# Altium footprint library USB-Mini_USB-Micro_USB.PcbLib: 33 footprints (part 2 of 3)
Each footprint in its own frame and in the unit in brackets; x right, y up, seen from the top. Pads: shape width x height; smd on the part's side, far side on the other; paste and mask are expansions set on the pad; w line width, h text height; cw(c..) or ccw(c..) is an arc to the next point about the centre after c.
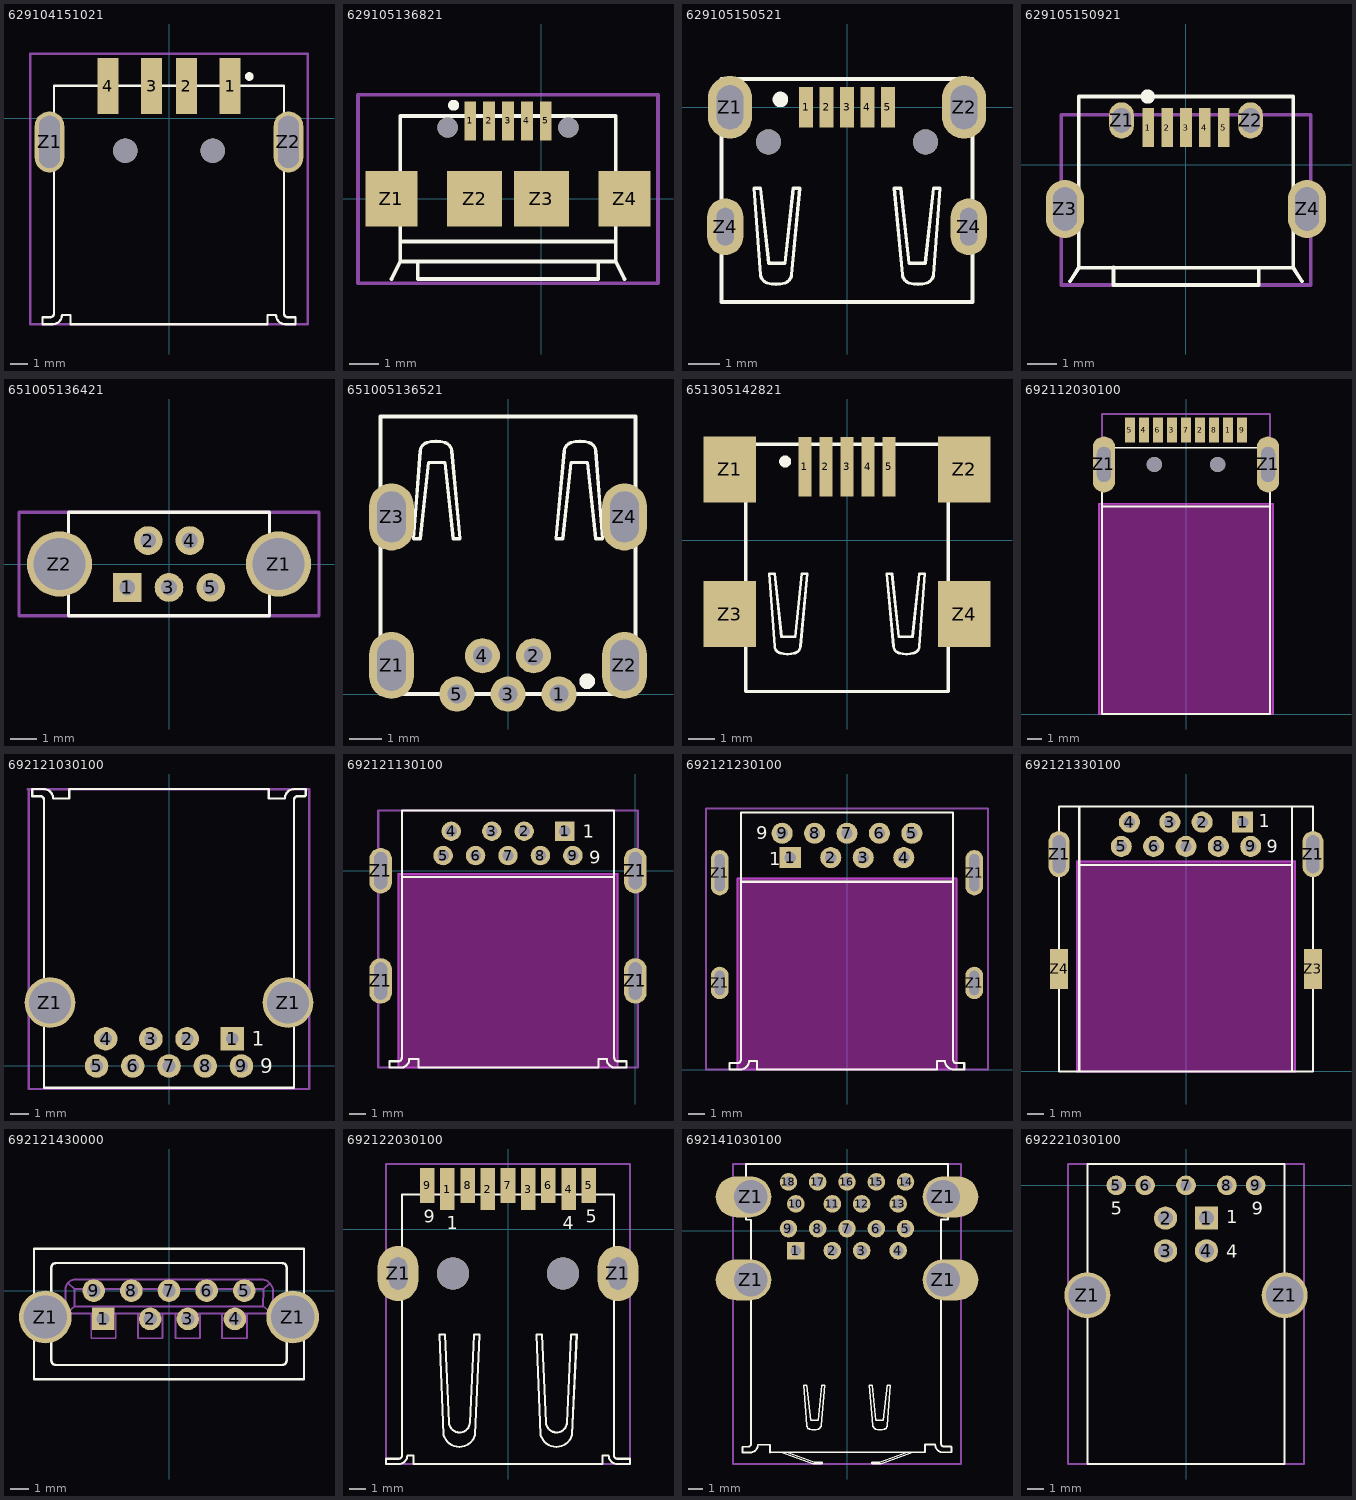
[diagram p1: the footprints below, top view; thin cyan lines are the x and y axes]

## 629104151021 [mm] "WR-COM_USB_Type A_Horizontal_SMT Type A Horizontal SMT - with Pegs - T&R Packaging"
height 7
pads (8):
  rect 1.2x3.2 smd: 1(3.5,1.85) 2(1,1.85) 3(-1,1.85) 4(-3.5,1.85)
  oval 1.7x3.5 hole 1.2 slot 3 at 90 deg: Z1(-6.85,-1.35) Z2(6.85,-1.35)
  round 1.4 hole 1.4 unplated: ""(-2.5,-1.85) ""(2.5,-1.85)
Top Overlay:
  circle w0.254: c4.6,2.4 r0.12
  lines w0.127: -7.25,-11.8 -7.25,-11.405 -6.798,-11.405 ccw(c-6.798,-11.208) -6.601,-11.208 -6.601,1.87 6.601,1.87 6.601,-11.208 ccw(c6.798,-11.208) 6.798,-11.405 7.25,-11.405 7.25,-11.8 6.667,-11.8 cw(c6.667,-11.273) 6.14,-11.273 5.64,-11.273 5.64,-11.8 -5.64,-11.8 -5.64,-11.273 -6.14,-11.273 cw(c-6.667,-11.273) -6.667,-11.8 -7.25,-11.8
Mechanical 15:
  lines w0.127: -7.95,-11.8 7.95,-11.8 7.95,3.7 -7.95,3.7 -7.95,-11.8
3D body: height 7.31, standoff -2.19, extent -7.25,-11.8 7.25,3.4

## 629105136821 [mm] "5 pins"
height 3
pads (11):
  rect 0.4x1.35 smd: 1(-2.45,2.675) 2(-1.8,2.675) 3(-1.15,2.675) 4(-0.5,2.675) 5(0.15,2.675)
  rect 1.8x1.9 smd: Z1(-5.15,0) Z4(2.85,0)
  rect 1.9x1.9 smd: Z2(-2.3,0) Z3(0,0)
  round 0.7 hole 0.7 unplated: ""(-3.225,2.45) ""(0.925,2.45)
Top Overlay:
  circle w0.254: c-3.02,3.215 r0.06
  lines w0.127: -5.15,-2.753 -4.85,-2.153 ; -4.85,-1.463 2.55,-1.463 ; -4.25,-2.153 -4.25,-2.75 1.95,-2.75 1.95,-2.153 ; 2.85,-2.753 2.55,-2.153 ; -4.85,-2.153 2.55,-2.153 ; -4.85,-2.153 -4.85,2.847 2.55,2.847 2.55,-2.153
Mechanical 15:
  lines w0.127: -6.3,-2.896 4,-2.896 4,3.575 -6.3,3.575 -6.3,-2.896
3D body: height 2.69, standoff -0.61, extent -5.15,-2.756 2.85,3.148

## 629105150521 [mm] "WR-COM_USB_Micro Type B_Horizontal_SMT Micro Type B Horizontal SMT - 3A current at Pin1 & Pin 5 - with Pegs and THT shielding Pins  - T&R Packaging"
height 2.6
pads (11):
  rect 0.45x1.3 smd: 1(-1.3,0) 2(-0.65,0) 3(0,0) 4(0.65,0) 5(1.3,0)
  oval 1.4x2 hole 0.85 slot 1.4 at 90 deg: Z1(-3.725,0) Z2(3.725,0)
  oval 1.15x1.8 hole 0.55 slot 1.2 at 90 deg: Z4(-3.875,-3.8) Z4(3.875,-3.8)
  round 0.8 hole 0.8 unplated: ""(-2.5,-1.1) ""(2.5,-1.1)
Top Overlay:
  circle w0.254: c-2.12,0.25 r0.12
  lines w0.102: -2.751,-5.328 -2.959,-2.577 -2.751,-2.577 -2.492,-4.965 -1.973,-4.965 -1.713,-2.577 -1.505,-2.577 -1.765,-5.328 ; -2.751,-5.328 ccw(c-2.457,-5.306) -2.544,-5.588 ccw(c-2.258,-4.657) -1.973,-5.588 ccw(c-2.059,-5.306) -1.765,-5.328 ; 1.765,-5.328 1.505,-2.577 1.713,-2.577 1.973,-4.965 2.492,-4.965 2.751,-2.577 2.959,-2.577 2.751,-5.328 ; 1.765,-5.328 ccw(c2.059,-5.306) 1.973,-5.588 ccw(c2.258,-4.657) 2.544,-5.588 ccw(c2.457,-5.306) 2.751,-5.328
  lines w0.127: -4,-6.2 4,-6.2 4,0.9 -4,0.9 -4,-6.2
3D body: height 2.67, standoff -0.89, extent -4.001,-6.25 3.999,0.353

## 629105150921 [mm] "WR-COM_USB_Micro Type AB_Horizontal_SMT Micro Type AB Horizontal SMT - with Pegs - T&R Packaging"
height 5
pads (9):
  rect 0.4x1.35 smd: 1(-1.3,1.278) 2(-0.65,1.278) 3(0,1.278) 4(0.65,1.278) 5(1.3,1.278)
  oval 0.85x1.25 hole 0.65 slot 0.85 at 90 deg: Z1(-2.225,1.528) Z2(2.225,1.528)
  oval 1.325x2 hole 0.825 slot 1.5 at 90 deg: Z3(-4.175,-1.527) Z4(4.175,-1.527)
Top Overlay:
  circle w0.254: c-1.32,2.35 r0.12
  lines w0.127: -4,-4.027 -3.7,-3.557 ; -2.5,-3.55 -2.5,-4.15 2.51,-4.15 2.51,-3.557 ; 4,-4.027 3.7,-3.557 ; -3.7,-3.557 -3.7,2.35 3.7,2.35 3.7,-3.557 ; -3.7,-3.557 3.7,-3.557
Mechanical 15:
  lines w0.127: -4.3,-4.15 -4.3,1.72 4.3,1.72 4.3,-4.15 -4.3,-4.15
3D body: height 2.73, standoff -0.55, extent -4.3,-4.15 4.3,1.72

## 651005136421 [mm] "5 pins"
height 3.9
pads (7):
  rect 1.1x1.1 hole 0.6: 1(-1.6,-0.9)
  round 1.1 hole 0.6: 2(-0.8,0.9) 3(0,-0.9) 4(0.8,0.9) 5(1.6,-0.9)
  round 2.5 hole 2: Z1(4.2,0) Z2(-4.2,0)
Top Overlay:
  lines w0.127: -3.85,-1.98 3.85,-1.98 3.85,1.98 -3.85,1.98 -3.85,-1.98
Mechanical 15:
  lines w0.127: -5.75,-1.98 5.75,-1.98 5.75,1.98 -5.75,1.98 -5.75,-1.98
3D body: height 9.21, standoff -2.79, extent -5.098,-1.95 5.098,1.95

## 651005136521 [mm] "5 pins"
height 3.9
pads (9):
  round 1.1 hole 0.6: 1(1.6,0) 2(0.8,1.2) 3(0,0) 4(-0.8,1.2) 5(-1.6,0)
  oval 1.4x2.1 hole 0.9 slot 1.6 at 90 deg: Z1(-3.65,0.9) Z2(3.65,0.9) Z3(-3.65,5.55) Z4(3.65,5.55)
Top Overlay:
  circle w0.254: c2.48,0.4 r0.12
  lines w0.102: -2.959,4.867 -2.751,4.867 -2.492,7.255 -1.973,7.255 -1.713,4.867 -1.505,4.867 -1.765,7.618 ccw(c-2.059,7.596) -1.972,7.878 ccw(c-2.258,6.947) -2.544,7.878 ccw(c-2.457,7.596) -2.751,7.618 -2.959,4.867 ; 1.505,4.867 1.713,4.867 1.973,7.255 2.492,7.255 2.751,4.867 2.959,4.867 2.751,7.618 ccw(c2.457,7.596) 2.544,7.878 ccw(c2.258,6.947) 1.973,7.878 ccw(c2.059,7.596) 1.765,7.618 1.505,4.867
  lines w0.127: -4,0 -4,8.7 4,8.7 4,0 -4,0
3D body: height 3.91, standoff -2.59, extent -4.075,-0.125 4.075,8.7

## 651305142821 [mm] "5 pins"
height 4
pads (9):
  rect 0.5x2.25 smd: 1(-1.6,2.8) 2(-0.8,2.8) 3(0,2.8) 4(0.8,2.8) 5(1.6,2.8)
  rect 2x2.5 smd: Z1(-4.45,2.7) Z2(4.45,2.7) Z3(-4.45,-2.8) Z4(4.45,-2.8)
Top Overlay:
  circle w0.254: c-2.35,3 r0.1
  lines w0.102: -2.544,-4.278 cw(c-2.457,-3.996) -2.751,-4.019 -2.959,-1.267 -2.751,-1.267 -2.492,-3.655 -1.973,-3.655 -1.713,-1.267 -1.505,-1.267 -1.765,-4.018 cw(c-2.059,-3.996) -1.973,-4.278 ; -2.544,-4.278 ccw(c-2.258,-3.347) -1.973,-4.278 ; 1.973,-4.278 cw(c2.059,-3.996) 1.765,-4.019 1.505,-1.267 1.713,-1.267 1.973,-3.655 2.492,-3.655 2.751,-1.267 2.959,-1.267 2.751,-4.018 cw(c2.457,-3.996) 2.544,-4.278 ; 1.973,-4.278 ccw(c2.258,-3.347) 2.544,-4.278
  lines w0.127: -3.85,-5.74 3.85,-5.74 3.85,3.66 -3.85,3.66 -3.85,-5.74
3D body: height -0.27, standoff -4.37, extent -4.95,-5.74 4.95,3.66

## 692112030100 [mm] "Plug SMT"
height 0.85
pads (13):
  rect 0.7x1.8 smd: 1(3,20.25) 2(1,20.25) 3(-1,20.25) 4(-3,20.25) 5(-4,20.25) 6(-2,20.25) 7(0,20.25) 8(2,20.25) 9(4,20.25)
  oval 1.6x4 hole 1 slot 2.5 at 90 deg: Z1(-5.85,17.8) Z1(5.85,17.8)
  round 1.1 hole 1.1 unplated: ""(-2.25,17.8) ""(2.25,17.8)
Top Overlay:
  lines w0.127: -6,14.8 6,14.8 ; -6,0 -6,18.99 6,18.99 6,0 -6,0
Keep-Out Layer:
  board cut-out: -6.2,0 6.2,0 6.2,15 -6.2,15
Mechanical 1:
  text "Milling Area" at -3.5,7.125 h1.52
Mechanical 1 keep-out:
  lines w0.127: -6.2,0 6.2,0 6.2,15 -6.2,15 -6.2,0
Mechanical 15:
  lines w0.127: -6,0 6,0 6,21.4 -6,21.4 -6,0
3D body: height 1.89, standoff -2.61, extent -5.998,0 6.002,20.754

## 692121030100 [mm] "Receptacle Through hole"
height 6.99
pads (11):
  rect 1.3x1.3 hole 0.7: 1(3.5,1.5)
  round 1.3 hole 0.7: 2(1,1.5) 3(-1,1.5) 4(-3.5,1.5) 5(-4,0) 6(-2,0) 7(0,0) 8(2,0) 9(4,0)
  round 2.8 hole 2.3: Z1(-6.57,3.5) Z1(6.57,3.5)
Top Overlay:
  lines w0.127: -7.55,14.897 -7.55,15.292 -6.927,15.292 cw(c-6.927,14.766) -6.4,14.766 -5.5,14.766 -5.5,15.292 5.5,15.292 5.5,14.766 6.4,14.766 cw(c6.926,14.766) 6.926,15.292 7.55,15.292 7.55,14.963 cw(c7.484,14.963) 7.484,14.897 7.097,14.897 ccw(c7.097,14.7) 6.9,14.7 6.9,-1.2 -6.9,-1.2 -6.9,14.7 ccw(c-7.097,14.7) -7.097,14.897 -7.55,14.897
  text "9" at 5.05,-0.4 h0.8
  text "1" at 4.58,1.12 h0.8
Mechanical 15:
  lines w0.127: -7.8,15.28 7.74,15.28 7.74,-1.27 -7.74,-1.27 -7.74,15.21
3D body: height 7.99, standoff -3.23, extent -7.74,-1.27 7.74,15.28

## 692121130100 [mm] "Receptacle TH Reverse Offset 0.14mm"
height 1.84
pads (13):
  rect 1.2x1.2 hole 0.7: 1(-4.35,2.43)
  round 1.2 hole 0.7: 2(-6.85,2.43) 3(-8.85,2.43) 4(-11.35,2.43) 5(-11.85,0.93) 6(-9.85,0.93) 7(-7.85,0.93) 8(-5.85,0.93) 9(-3.85,0.93)
  oval 1.4x2.8 hole 0.8 slot 2.3 at 90 deg: Z1(-15.7,-6.8) Z1(-15.7,0) Z1(0,-6.8) Z1(0,0)
Top Overlay:
  lines w0.127: -14.402,-11.558 cw(c-14.6,-11.558) -14.6,-11.755 -15.165,-11.755 -15.165,-12.15 -14.468,-12.15 ccw(c-14.468,-11.624) -13.942,-11.624 -13.36,-11.624 -13.36,-12.15 -2.258,-12.15 -2.258,-11.624 -1.758,-11.624 ccw(c-1.232,-11.624) -1.232,-12.15 -0.535,-12.15 -0.535,-11.755 -1.1,-11.755 cw(c-1.1,-11.558) -1.297,-11.558 ; -14.4,-11.59 -14.4,3.72 -1.3,3.72 -1.3,-11.55 ; -14.4,-0.4 -1.3,-0.4
  text "9" at -2.85,0.43 h0.8
  text "1" at -3.25,2.03 h0.8
Keep-Out Layer:
  board cut-out: -14.6,-0.2 -1.1,-0.2 -1.1,-12.15 -14.6,-12.15
Mechanical 1:
  text "Milling Area" at -11.45,-6.77 h1.52
Mechanical 1 keep-out:
  lines w0.127: -14.6,-12.15 -14.6,-0.2 -1.1,-0.2 -1.1,-12.15 -14.6,-12.15
Mechanical 15:
  lines w0.127: -15.85,-12.15 -15.85,3.72 0.15,3.72 0.15,-12.15 -15.85,-12.15
3D body: height 3.71, standoff -3.41, extent -15.85,-12.15 0.15,3.72

## 692121230100 [mm] "Receptacle Through hole Offset 1.04mm"
height 3.9
pads (13):
  rect 1.3x1.3 hole 0.7: 1(-3.5,13.08)
  round 1.3 hole 0.7: 2(-1,13.08) 3(1,13.08) 4(3.5,13.08) 5(4,14.58) 6(2,14.58) 7(0,14.58) 8(-2,14.58) 9(-4,14.58)
  oval 1.1x2 hole 0.6 slot 1.5 at 90 deg: Z1(-7.85,5.35) Z1(7.85,5.35)
  oval 1.1x2.8 hole 0.6 slot 2.3 at 90 deg: Z1(-7.85,12.15) Z1(7.85,12.15)
Top Overlay:
  lines w0.127: -6.55,11.59 6.55,11.59 ; 6.55,0.6 ccw(c6.747,0.6) 6.747,0.403 7.23,0.403 7.23,0.008 6.576,0.008 cw(c6.576,0.534) 6.05,0.534 5.55,0.534 5.55,0 -5.55,0 -5.55,0.534 -6.05,0.534 cw(c-6.577,0.534) -6.577,0.008 -7.25,0.008 -7.25,0.403 -6.748,0.403 ccw(c-6.748,0.6) -6.55,0.6 -6.55,15.87 6.55,15.87 6.55,0.6
  text "1" at -4.8,12.6 h0.8
  text "9" at -5.6,14.2 h0.8
Keep-Out Layer:
  board cut-out: -6.75,11.79 6.75,11.79 6.75,0 -6.75,0
Mechanical 1:
  text "Milling Area" at -3.6,5.38 h1.52
Mechanical 1 keep-out:
  lines w0.127: -6.75,0 6.75,0 6.75,11.79 -6.75,11.79 -6.75,0
Mechanical 15:
  lines w0.127: -8.7,0 8.7,0 8.7,16.12 -8.7,16.12 -8.7,0
3D body: height 2.09, standoff -5.03, extent -8,-0.005 8,15.865

## 692121330100 [mm] "Receptacle TH Reverse Offset 1.75mm"
height 4.54
pads (13):
  rect 1.3x1.3 hole 0.7: 1(3.5,15.41)
  round 1.3 hole 0.7: 2(1,15.41) 3(-1,15.41) 4(-3.5,15.41) 5(-4,13.91) 6(-2,13.91) 7(0,13.91) 8(2,13.91) 9(4,13.91)
  oval 1.3x2.85 hole 0.8 slot 2.35 at 90 deg: Z1(-7.85,13.43) Z1(7.85,13.43)
  rect 1.1x2.5 smd: Z3(7.85,6.33) Z4(-7.85,6.33)
Top Overlay:
  lines w0.127: -6.55,12.77 6.55,12.77 ; -7.85,0 -7.85,16.37 7.85,16.37 7.85,0 -7.85,0 ; -6.6,0 6.55,0 6.55,16.37 -6.6,16.37 -6.6,0
  text "9" at 5,13.51 h0.8
  text "1" at 4.5,15.11 h0.8
Keep-Out Layer:
  board cut-out: -6.75,12.97 6.75,12.97 6.75,0 -6.75,0
Mechanical 1:
  text "Milling Area" at -3.3,5.01 h1.52
Mechanical 1 keep-out:
  lines w0.127: -6.75,0 6.75,0 6.75,12.97 -6.75,12.97 -6.75,0
3D body: height 2.95, standoff -4.45, extent -8,0 8,16.37

## 692121430000 [mm] "Receptacle Through hole"
height 15
pads (11):
  rect 1.2x1.2 hole 0.7: 1(-3.5,-1.5)
  round 1.2 hole 0.7: 2(-1,-1.5) 3(1,-1.5) 4(3.5,-1.5) 5(4,0) 6(2,0) 7(0,0) 8(-2,0) 9(-4,0)
  round 2.8 hole 2.3: Z1(-6.57,-1.4) Z1(6.57,-1.4)
Top Overlay:
  lines w0.127: -6.25,-3.73 -6.25,1.22 ; -6.25,-3.7 ccw(c-6,-3.7) -6,-3.95 ; -6.25,1.22 cw(c-6,1.22) -6,1.47 6,1.47 cw(c6,1.22) 6.25,1.22 6.25,-3.7 cw(c6,-3.7) 6,-3.95 -6.03,-3.95 ; -7.175,-4.715 7.175,-4.715 7.175,2.235 -7.175,2.235 -7.175,-4.715
Mechanical 13:
  lines w0.102: -5.355,0.386 -5.012,0.086 ; -4.134,-1.242 -4.134,-2.527 -2.827,-2.527 -2.827,-1.242 ; -1.649,-1.242 -1.649,-2.527 -0.343,-2.527 -0.343,-1.264 ; 0.343,-1.285 0.343,-2.527 1.649,-2.527 1.649,-1.242 1.671,-1.242 ; 2.806,-1.264 2.806,-2.527 4.134,-2.527 4.134,-1.264 ; 5.333,0.364 5.012,0.086 ; -5.483,-1.221 5.526,-1.221 ; -5.483,-1.221 -5.504,-1.221 -5.504,0.064 cw(c-4.969,0.064) -4.969,0.6 4.883,0.6 cw(c4.883,-0.043) 5.526,-0.043 5.526,-1.221 ; -5.483,-1.221 -5.012,-0.835 ; -5.012,-0.835 4.99,-0.835 ; -5.012,-0.835 -5.012,0.086 ; -5.012,0.086 5.012,0.086 ; 4.99,-0.835 5.526,-1.221 ; 4.99,-0.835 5.012,0.086
3D body: height 15.01, standoff -3.76, extent -7.799,-4.715 7.799,2.235

## 692122030100 [mm] "Receptacle Dual port TH"
height 6.99
pads (13):
  rect 0.9x2.6 smd: 1(-3.75,2.498) 2(-1.25,2.498) 3(1.25,2.498) 4(3.75,2.498)
  rect 0.9x2.15 smd: 5(5,2.723) 6(2.5,2.723) 7(0,2.723) 8(-2.5,2.723) 9(-5,2.723)
  oval 2.52x3.4 hole 1.12 slot 2 at 90 deg: Z1(-6.8,-2.723) Z1(6.8,-2.723)
  round 2 hole 2 unplated: ""(-3.4,-2.723) ""(3.4,-2.723)
Top Overlay:
  lines w0.127: 2.099,-6.499 1.766,-6.499 2.02,-12.695 ccw(c2.991,-12.442) 3.961,-12.703 4.25,-6.5 3.9,-6.5 3.65,-11.95 cw(c3,-11.9) 2.348,-11.913 2.1,-6.5 ; -7.55,-14.5 -6.754,-14.5 ccw(c-6.754,-13.973) -6.228,-13.973 -5.85,-13.973 -5.85,-14.5 5.85,-14.5 5.85,-13.973 6.228,-13.973 ccw(c6.754,-13.973) 6.754,-14.5 7.55,-14.5 7.55,-14.179 6.755,-14.179 cw(c6.755,-13.973) 6.55,-13.973 6.55,2.15 -6.55,2.15 -6.55,-13.973 cw(c-6.755,-13.973) -6.755,-14.179 -7.55,-14.179 -7.55,-14.5 ; -4.234,-6.499 -3.98,-12.695 ccw(c-3.009,-12.442) -2.039,-12.703 -1.75,-6.5 -2.1,-6.5 -2.35,-11.95 cw(c-3,-11.9) -3.652,-11.913 -3.9,-6.5 -4.234,-6.499
  text "1" at -3.8,0 h0.8
  text "4" at 3.4,0 h0.8
  text "9" at -5.2,0.4 h0.8
  text "5" at 4.8,0.4 h0.8
Mechanical 15:
  lines w0.127: -7.55,-14.503 7.55,-14.503 7.55,4.048 -7.55,4.048 -7.55,-14.503
3D body: height 7.98, standoff -2.26, extent -7.546,-14.502 7.554,3.298

## 692141030100 [mm] "Receptacle Dual port TH"
height 13.62
pads (22):
  rect 1.2x1.2 hole 0.7: 1(-3.5,-1.35)
  round 1.2 hole 0.7: 2(-1,-1.35) 3(1,-1.35) 4(3.5,-1.35) 5(4,0.15) 6(2,0.15) 7(0,0.15) 8(-2,0.15) 9(-4,0.15) 10(-3.5,1.85) 11(-1,1.85) 12(1,1.85) 13(3.5,1.85) 14(4,3.35) 15(2,3.35) 16(0,3.35) 17(-2,3.35) 18(-4,3.35)
  oval 3.8x2.8 hole 2.3 copper offset -0.5,0: Z1(-6.57,-3.35) Z1(-6.57,2.33)
  oval 3.8x2.8 hole 2.3 copper offset 0.5,0: Z1(6.57,-3.35) Z1(6.57,2.33)
Top Overlay:
  lines w0.102: -4.506,-15.13 -2.325,-15.925 -1.75,-15.925 ccw(c-1.75,-15.862) -1.75,-15.8 -2.25,-15.8 -4.122,-15.13 ; 4.122,-15.13 2.25,-15.8 1.75,-15.8 ccw(c1.75,-15.862) 1.75,-15.925 2.325,-15.925 4.486,-15.13 ; -2.959,-10.542 -2.751,-10.542 -2.492,-12.93 -1.973,-12.93 -1.713,-10.542 -1.505,-10.542 -1.765,-13.293 cw(c-2.059,-13.271) -1.973,-13.553 cw(c-2.258,-12.622) -2.544,-13.553 cw(c-2.457,-13.271) -2.751,-13.293 -2.959,-10.542 ; 1.505,-10.542 1.713,-10.542 1.973,-12.93 2.492,-12.93 2.751,-10.542 2.959,-10.542 2.751,-13.293 cw(c2.457,-13.271) 2.543,-13.553 cw(c2.258,-12.622) 1.973,-13.553 cw(c2.059,-13.271) 1.765,-13.293 1.505,-10.542
  lines w0.127: -5.262,-15.142 -5.262,-14.616 -6.089,-14.616 cw(c-6.616,-14.616) -6.616,-15.142 -7.142,-15.142 -7.142,-14.747 -6.747,-14.747 ccw(c-6.747,-14.55) -6.55,-14.55 -6.55,0.76 -6.9,0.76 -6.9,4.57 6.9,4.57 6.9,0.78 ; -5.25,-15.13 5.32,-15.13 5.32,-14.603 6.031,-14.603 ccw(c6.558,-14.603) 6.558,-15.13 7.15,-15.13 7.15,-14.801 ccw(c7.084,-14.801) 7.084,-14.735 6.623,-14.735 cw(c6.623,-14.538) 6.426,-14.538 6.426,0.78 6.894,0.78
Mechanical 13:
  text "1" at -4.3,-1.85 h0.8
  text "9" at -5.1,-0.25 h0.8
  text "10" at -4.5,1.45 h0.8
  text "18" at -5,3.15 h0.8
Mechanical 15:
  lines w0.127: -7.794,-15.93 7.794,-15.93 7.794,4.57 -7.794,4.57 -7.794,-15.93
3D body: height 16.11, standoff -3.5, extent -7.794,-15.93 7.794,4.57

## 692221030100 [mm] "Receptacle TH"
height 12.2
pads (11):
  rect 1.42x1.42 hole 0.92: 1(1.25,-2)
  round 1.42 hole 0.92: 2(-1.25,-2) 3(-1.25,-4) 4(1.25,-4)
  round 1.2 hole 0.7: 5(-4.25,0) 6(-2.5,0) 7(0,0) 8(2.5,0) 9(4.25,0)
  round 2.8 hole 2.3: Z1(-6.02,-6.71) Z1(6.02,-6.71)
Top Overlay:
  lines w0.127: -6,-17 -6,1.3 6,1.3 6,-17 -6,-17
  text "9" at 4,-1.8 h0.8
  text "5" at -4.6,-1.8 h0.8
  text "4" at 2.46,-4.415 h0.8
  text "1" at 2.46,-2.325 h0.8
Mechanical 15:
  lines w0.127: -7.2,-17 -7.2,1.3 7.2,1.3 7.2,-17 -7.2,-17
3D body: height 12.91, standoff -2.65, extent -7.199,-17 7.199,1.3